# Altium footprint library connector.PcbLib: 172 footprints (part 6 of 11)
Each footprint in its own frame and in the unit in brackets; x right, y up, seen from the top. Pads: shape width x height; smd on the part's side, far side on the other; paste and mask are expansions set on the pad; w line width, h text height; cw(c..) or ccw(c..) is an arc to the next point about the centre after c.
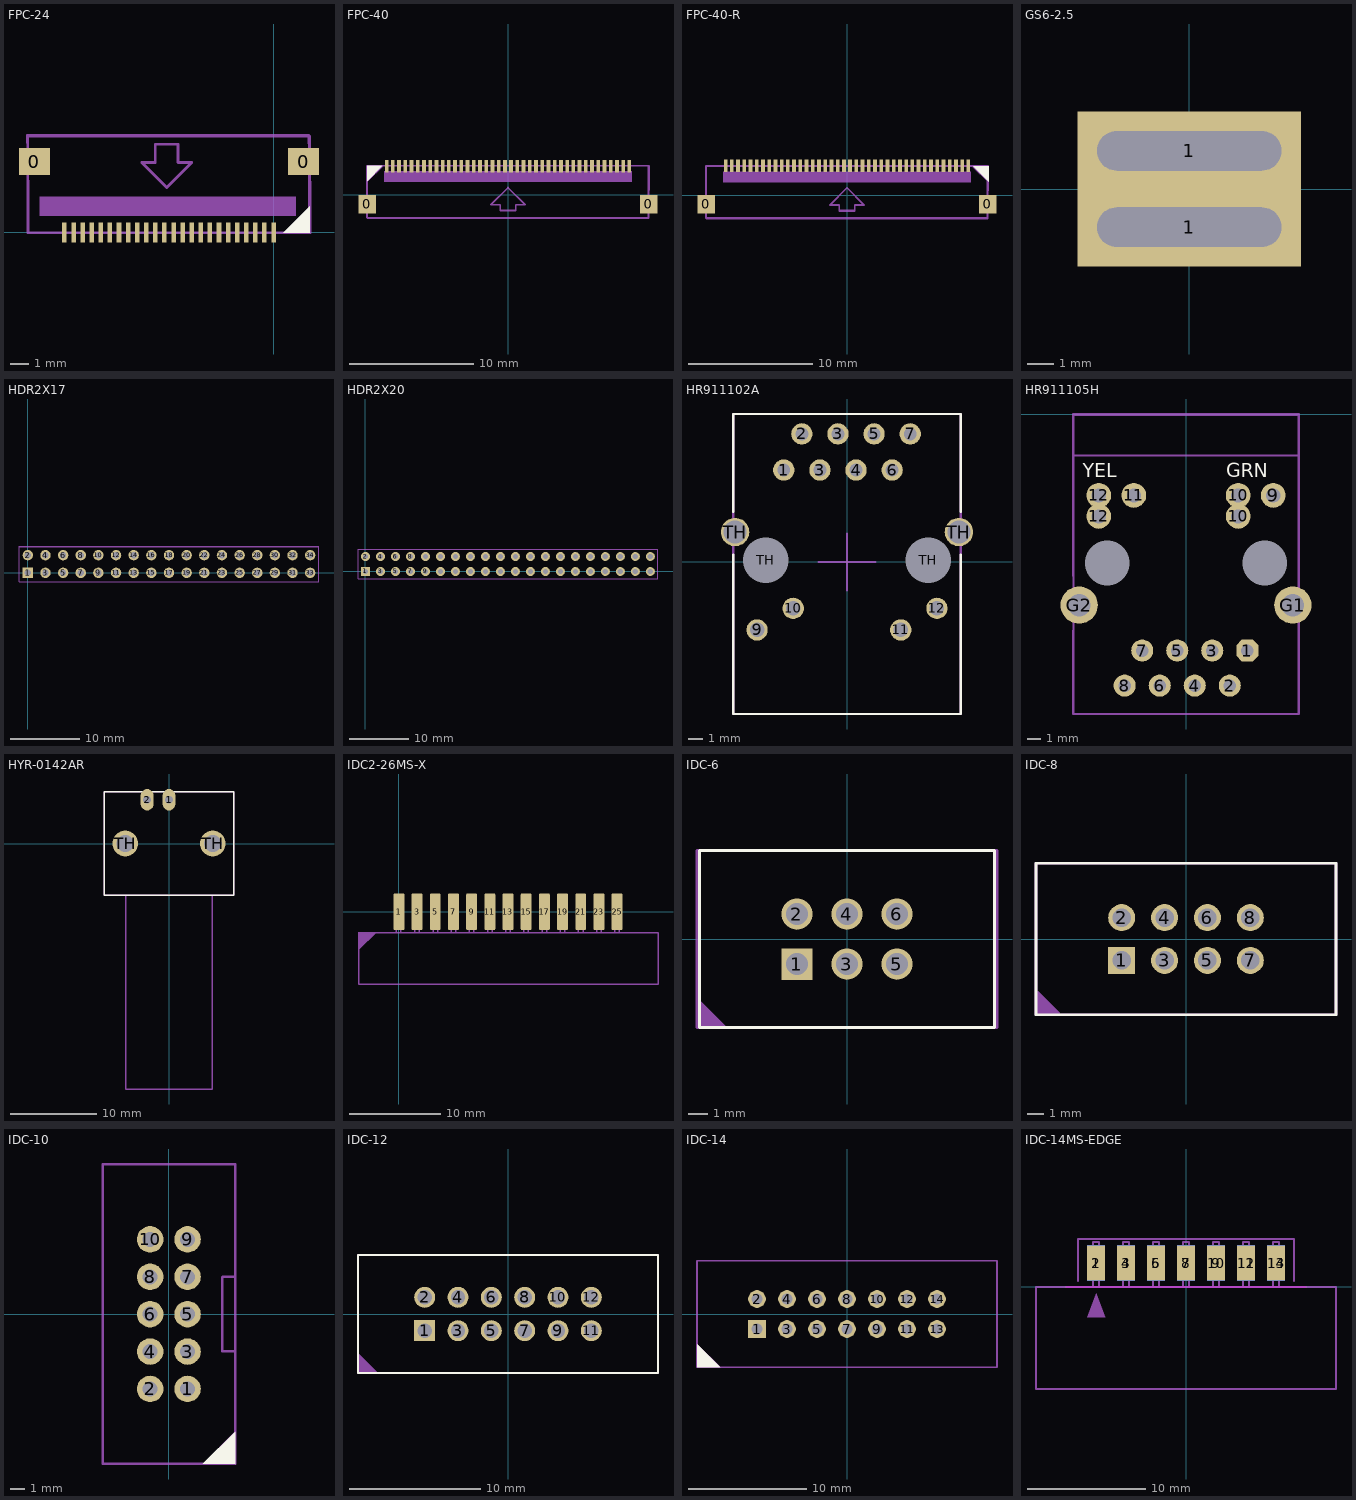
[diagram p5: the footprints below, top view; thin cyan lines are the x and y axes]

## FPC-24 [mm]
pads (26):
  rect 1.7x1.5 smd: 0(-13.15,3.9) 0(1.65,3.9)
  rect 0.25x1.1 smd: 1(0,0) 2(-0.5,0) 3(-1,0) 4(-1.5,0) 5(-2,0) 6(-2.5,0) 7(-3,0) 8(-3.5,0) 9(-4,0) 10(-4.5,0) 11(-5,0) 12(-5.5,0) 13(-6,0) 14(-6.5,0) 15(-7,0) 16(-7.5,0) 17(-8,0) 18(-8.5,0) 19(-9,0) 20(-9.5,0) 21(-10,0) 22(-10.5,0) 23(-11,0) 24(-11.5,0)
Top Overlay:
  region: 0.525,-0.025 2,-0.025 2,1.45
Mechanical 29:
  rectangle: -12.875,0.9 1.225,1.975
  region: 2,1.275 1.975,1.25 1.975,-0.025 0.7,-0.025
  lines w0.15: -13.55,4.925 -13.55,5.325 1.95,5.325 1.95,4.9 ; -13.5,2.85 -13.5,-0.025 -11.825,-0.025 ; 0.325,-0.025 2,-0.025 2,2.8 ; -7.25,3.85 -6.5,3.85 ; -7.25,3.85 -5.875,2.475 ; -7.25,3.85 -6.5,3.85 ; -7.25,3.85 -5.875,2.475 ; -6.5,3.85 -6.5,4.85 ; -6.5,3.85 -6.5,4.85 ; -6.5,4.85 -5.25,4.85 ; -6.5,4.85 -5.25,4.85 ; -5.875,2.475 -4.5,3.85 ; -5.875,2.475 -4.5,3.85 ; -5.25,3.85 -4.5,3.85 ; -5.25,3.85 -5.25,4.85 ; -5.25,3.85 -4.5,3.85 ; -5.25,3.85 -5.25,4.85 ; -13.525,-0.025 1.975,-0.025 1.975,5.3 -13.525,5.3 -13.525,-0.025
  text ".Designator" at -12.5,3.2 h1

## FPC-40 [mm]
pads (42):
  rect 1.4x1.5 smd: 0(-11.3,-0.75) 0(11.3,-0.75)
  rect 0.3x1 smd: 1(-9.75,2.3) 2(-9.25,2.3) 3(-8.75,2.3) 4(-8.25,2.3) 5(-7.75,2.3) 6(-7.25,2.3) 7(-6.75,2.3) 8(-6.25,2.3) 9(-5.75,2.3) 10(-5.25,2.3) 11(-4.75,2.3) 12(-4.25,2.3) 13(-3.75,2.3) 14(-3.25,2.3) 15(-2.75,2.3) 16(-2.25,2.3) 17(-1.75,2.3) 18(-1.25,2.3) 19(-0.75,2.3) 20(-0.25,2.3) 21(0.25,2.3) 22(0.75,2.3) 23(1.25,2.3) 24(1.75,2.3) 25(2.25,2.3) 26(2.75,2.3) 27(3.25,2.3) 28(3.75,2.3) 29(4.25,2.3) 30(4.75,2.3) 31(5.25,2.3) 32(5.75,2.3) 33(6.25,2.3) 34(6.75,2.3) 35(7.25,2.3) 36(7.75,2.3) 37(8.25,2.3) 38(8.75,2.3) 39(9.25,2.3) 40(9.75,2.3)
Top Overlay:
  region: -11.325,1.1 -11.325,2.325 -10.1,2.325
Mechanical 29:
  region: 9.95,1.9 -9.975,1.9 -9.975,1.025 9.95,1.025
  region: -11.3,1.025 -11.275,1.05 -11.275,2.325 -10,2.325
  lines w0.15: -11.325,0.375 -11.325,2.325 ; -11.3,-1.875 -0.55,-1.875 11.3,-1.875 ; -10.2,2.325 -11.325,2.325 ; 10.2,2.325 11.325,2.325 11.325,0.375 ; -11.325,2.325 -11.325,-1.85 11.3,-1.85 11.3,2.325 -11.325,2.325 ; -1.375,-0.8 0,0.575 ; -1.375,-0.8 -0.625,-0.8 ; -1.375,-0.8 0,0.575 ; -1.375,-0.8 -0.625,-0.8 ; -0.625,-0.8 -0.625,-1.25 0.625,-1.25 0.625,-0.8 ; -0.625,-0.8 -0.625,-1.275 0.625,-1.275 0.625,-0.8 ; 0,0.575 1.375,-0.8 ; 0,0.575 1.375,-0.8 ; 0.625,-0.8 1.375,-0.8 ; 0.625,-0.8 1.375,-0.8
  text ".Designator" at -8.5,-0.675 h1
3D body "FPC-40.STEP": height 1.2, standoff -0.02, extent -11.025,-0.95 10.975,2.05

## FPC-40-R [mm]
pads (42):
  rect 1.4x1.5 smd: 0(-11.3,-0.75) 0(11.3,-0.75)
  rect 0.3x1 smd: 1(9.75,2.35) 2(9.25,2.35) 3(8.75,2.35) 4(8.25,2.35) 5(7.75,2.35) 6(7.25,2.35) 7(6.75,2.35) 8(6.25,2.35) 9(5.75,2.35) 10(5.25,2.35) 11(4.75,2.35) 12(4.25,2.35) 13(3.75,2.35) 14(3.25,2.35) 15(2.75,2.35) 16(2.25,2.35) 17(1.75,2.35) 18(1.25,2.35) 19(0.75,2.35) 20(0.25,2.35) 21(-0.25,2.35) 22(-0.75,2.35) 23(-1.25,2.35) 24(-1.75,2.35) 25(-2.25,2.35) 26(-2.75,2.35) 27(-3.25,2.35) 28(-3.75,2.35) 29(-4.25,2.35) 30(-4.75,2.35) 31(-5.25,2.35) 32(-5.75,2.35) 33(-6.25,2.35) 34(-6.75,2.35) 35(-7.25,2.35) 36(-7.75,2.35) 37(-8.25,2.35) 38(-8.75,2.35) 39(-9.25,2.35) 40(-9.75,2.35)
Top Overlay:
  region: 10.142,2.308 11.367,2.308 11.367,1.083
Mechanical 29:
  region: 9.95,1.9 -9.975,1.9 -9.975,1.025 9.95,1.025
  region: 10.067,2.283 10.092,2.258 11.367,2.258 11.367,0.983
  lines w0.15: -11.325,0.375 -11.325,2.325 ; -11.3,-1.875 -0.55,-1.875 11.3,-1.875 ; -10.2,2.325 -11.325,2.325 ; 10.2,2.325 11.325,2.325 11.325,0.375 ; -11.325,2.325 -11.325,-1.85 11.3,-1.85 11.3,2.325 -11.325,2.325 ; -1.375,-0.8 0,0.575 ; -1.375,-0.8 -0.625,-0.8 ; -1.375,-0.8 0,0.575 ; -1.375,-0.8 -0.625,-0.8 ; -0.625,-0.8 -0.625,-1.275 0.625,-1.275 0.625,-0.8 ; -0.625,-0.8 -0.625,-1.25 0.625,-1.25 0.625,-0.8 ; 0,0.575 1.375,-0.8 ; 0,0.575 1.375,-0.8 ; 0.625,-0.8 1.375,-0.8 ; 0.625,-0.8 1.375,-0.8
  text ".Designator" at -10,-0.8 h1
3D body "FPC-40.STEP": height 1.2, standoff -0.02, extent -11.025,-0.95 10.975,2.05

## GS6-2.5 [mm]
pads (2):
  rect 8.5x3 hole 1.5 slot 7 at 0 deg: 1(0,-1.45) 1(0,1.45)
Multi-Layer:
  pour cut-out: -4.5,3 -3,3 -3,-3 -4.5,-3
3D body "GS6-2.5.STEP": height 1.15, standoff -2.75, extent -16.5,-5 2.5,5

## HDR2X17 [mm] "Connector; Header; 17x2 Position"
pads (34):
  rect 1.5x1.5 hole 0.9: 1(0,0)
  round 1.5 hole 0.9: 2(0,2.54) 3(2.54,0) 4(2.54,2.54) 5(5.08,0) 6(5.08,2.54) 7(7.62,0) 8(7.62,2.54) 9(10.16,0) 10(10.16,2.54) 11(12.7,0) 12(12.7,2.54) 13(15.24,0) 14(15.24,2.54) 15(17.78,0) 16(17.78,2.54) 17(20.32,0) 18(20.32,2.54) 19(22.86,0) 20(22.86,2.54) 21(25.4,0) 22(25.4,2.54) 23(27.94,0) 24(27.94,2.54) 25(30.48,0) 26(30.48,2.54) 27(33.02,0) 28(33.02,2.54) 29(35.56,0) 30(35.56,2.54) 31(38.1,0) 32(38.1,2.54) 33(40.64,0) 34(40.64,2.54)
Mechanical 29:
  lines w0.15: 41.9,3.81 -1.27,3.81 -1.27,-1.27 41.91,-1.27 41.91,3.81 ; -1.25,-1.25 -1.25,3.75 41.9,3.75 41.9,-1.25 -1.25,-1.25
  text ".Designator" at 17.5,1.2 h1

## HDR2X20 [mm] "Connector; Header; 20x2 Position"
pads (40):
  rect 1.5x1.5 hole 0.9: 1(0,0)
  round 1.5 hole 0.9: 2(0,2.54) 3(2.54,0) 4(2.54,2.54) 5(5.08,0) 6(5.08,2.54) 7(7.62,0) 8(7.62,2.54) 9(10.16,0) 10(10.16,2.54) 11(12.7,0) 12(12.7,2.54) 13(15.24,0) 14(15.24,2.54) 15(17.78,0) 16(17.78,2.54) 17(20.32,0) 18(20.32,2.54) 19(22.86,0) 20(22.86,2.54) 21(25.4,0) 22(25.4,2.54) 23(27.94,0) 24(27.94,2.54) 25(30.48,0) 26(30.48,2.54) 27(33.02,0) 28(33.02,2.54) 29(35.56,0) 30(35.56,2.54) 31(38.1,0) 32(38.1,2.54) 33(40.64,0) 34(40.64,2.54) 35(43.18,0) 36(43.18,2.54) 37(45.72,0) 38(45.72,2.54) 39(48.26,0) 40(48.26,2.54)
Mechanical 29:
  lines w0.15: -1.27,-1.27 -1.27,3.81 49.53,3.81 49.53,-1.27 -1.27,-1.27 ; -1.25,-1.25 49.55,-1.25 49.55,3.75 -1.25,3.75 -1.25,-1.25
  text ".Designator" at 21.5,0.7 h1
3D body "11437.stp": height 8.8, standoff -3, extent -1.25,-1.25 49.55,3.75

## HR911102A [mm]
height 14
pads (16):
  round 1.5 hole 0.9: 1(-4.445,6.46) 2(-3.175,9) 3(-1.905,6.46) 3(-0.635,9) 4(0.635,6.46) 5(1.905,9) 6(3.175,6.46) 7(4.445,9)
  round 1.5 hole 1.02: 9(-6.325,-4.79) 10(-3.785,-3.27) 11(3.785,-4.79) 12(6.325,-3.27)
  round 2 hole 1.6: TH(-7.875,2.1) TH(7.875,2.1)
  round 1.5 hole 3.2 unplated: TH(-5.715,0.11) TH(5.715,0.11)
Top Overlay:
  lines w0.15: -8,0.5 -8,-10.7 8,-10.7 8,0.5 ; -8,3.5 -8,10.4 8,10.4 8,3.5
Mechanical 15:
  lines w0.15: -2,0 2,0 ; 0,-2 0,2
Mechanical 29:
  lines w0.15: -8,-10.7 -8,10.4 8,10.4 8,-10.7 -8,-10.7
  text ".Designator" at -3.5,-0.8 h1
3D body: height 14, standoff 0.5, extent -8.075,-10.775 8.075,10.475
3D body: height 4, standoff 1.5, extent -6.5,-10.9 -3,-10.4
3D body: height 4, standoff 1.5, extent 3,-10.9 6.5,-10.4

## HR911105H [mm] "TRJ0011GBNL -- CONN RJ45  WITH MAGNETIC AND LEDS"
height 13.45
pads (18):
  oct 1.6x1.6 hole 0.9: 1(4.445,-17.15)
  round 1.6 hole 0.9: 2(3.175,-19.69) 3(1.905,-17.15) 4(0.635,-19.69) 5(-0.635,-17.15) 6(-1.905,-19.69) 7(-3.175,-17.15) 8(-4.445,-19.69)
  round 1.8 hole 1.02: 9(6.325,-5.9) 10(3.785,-7.42) 10(3.785,-5.9) 11(-3.785,-5.9) 12(-6.325,-7.42) 12(-6.325,-5.9)
  round 2.7 hole 1.63: G1(7.745,-13.85) G2(-7.745,-13.85)
  round 0 hole 3.25: ""(-5.715,-10.8) ""(5.715,-10.8)
Top Overlay:
  text "YEL" at -7.493,-4.572 h1.02
  text "GRN" at 2.921,-4.572 h1.02
Mechanical 29:
  lines w0.15: -8.19,-15.688 -8.19,-21.75 8.19,-21.75 8.19,-15.688 ; -8.19,-11.754 -8.19,0 8.19,0 8.19,-11.754 ; -8.19,-3 8.19,-3 ; -8.15,-21.75 8.175,-21.75 8.175,-0.075 -8.15,-0.075 -8.15,-21.75
  text ".Designator" at -3.5,-12.8 h1
3D body "User Library-bothhandusalu1t516-43-lf.step": height 13.32, standoff -3.71, extent -7.67,-21.325 7.57,-0.025

## HYR-0142AR [mm]
pads (4):
  oval 1.5x2.5 hole 0.9: 1(0,5.08) 2(-2.54,5.08)
  round 3 hole 2: TH(-5.08,0) TH(5.08,0)
Top Overlay:
  lines w0.15: -7.5,-6 -7.5,6 7.5,6 7.5,-6 -7.5,-6
Mechanical 29:
  lines w0.15: -5,-6 -5,-28.5 5,-28.5 5,-6 ; -7.5,-6 -7.5,6 7.5,6 7.5,-6 -7.5,-6
  text ".designator" at -5.5,0 h1.5
3D body "HYR-0142AR.STEP": height 12.5, standoff -4, extent -7.35,-28.45 7.35,6.05

## IDC2-26MS-X [mm]
pads (13):
  rrect20% 1.2x4 smd: 1(0,0) 3(2,0) 5(4,0) 7(6,0) 9(8,0) 11(10,0) 13(12,0) 15(14,0) 17(16,0) 19(18,0) 21(20,0) 23(22,0) 25(24,0)
Mechanical 29:
  region: -4.4,-2.3 -2.5,-2.3 -4.4,-4.2
  lines w0.15: -4.5,-2.3 28.5,-2.3 ; 28.5,-2.3 -4.4,-2.3 -4.4,-8 28.5,-8 28.5,-2.3 ; -0.3,-2.3 -0.3,1.6 0.2,1.6 0.2,-2.3 -0.3,-2.3 ; 1.75,-2.3 2.25,-2.3 2.25,1.6 1.75,1.6 1.75,-2.3 ; 3.75,-2.3 4.25,-2.3 4.25,1.6 3.75,1.6 3.75,-2.3 ; 5.75,-2.3 6.25,-2.3 6.25,1.6 5.75,1.6 5.75,-2.3 ; 7.75,-2.3 8.25,-2.3 8.25,1.6 7.75,1.6 7.75,-2.3 ; 9.75,-2.3 10.25,-2.3 10.25,1.6 9.75,1.6 9.75,-2.3 ; 11.75,-2.3 12.25,-2.3 12.25,1.6 11.75,1.6 11.75,-2.3 ; 13.75,-2.3 14.25,-2.3 14.25,1.6 13.75,1.6 13.75,-2.3 ; 15.75,-2.3 16.25,-2.3 16.25,1.6 15.75,1.6 15.75,-2.3 ; 17.75,-2.3 18.25,-2.3 18.25,1.6 17.75,1.6 17.75,-2.3 ; 19.75,-2.3 20.25,-2.3 20.25,1.6 19.75,1.6 19.75,-2.3 ; 21.75,-2.3 22.25,-2.3 22.25,1.6 21.75,1.6 21.75,-2.3 ; 23.75,-2.3 23.75,1.6 24.25,1.6 24.25,-2.3 23.75,-2.3
  text ".Designator" at 8.5,-5.8 h1
3D body "User Library-BH2-xx.step": height 3.95, standoff -1.5, extent -4.525,-7.9 28.475,1.35

## IDC-6 [mm]
height 8
pads (6):
  rect 1.6x1.6 hole 1.1: 1(-2.54,-1.27)
  round 1.6 hole 1.1: 2(-2.54,1.27) 3(0,-1.27) 4(0,1.27) 5(2.54,-1.27) 6(2.54,1.27)
Top Overlay:
  lines w0.15: -7.5,-4.5 -7.5,4.5 7.5,4.5 7.5,-4.5 -7.5,-4.5
Mechanical 29:
  region: -7.62,-4.5 -7.62,-2.976 -6.096,-4.5
  lines w0.15: -7.62,-4.5 7.62,-4.5 7.62,4.5 -7.62,4.5 -7.62,-4.5
  text ".Designator" at -3.5,-0.3 h1
3D body "PLS-1.STEP": height 8.5, standoff -3, extent -3.81,-2.54 -1.27,0
3D body "PLS-1.STEP": height 8.5, standoff -3, extent -3.81,0 -1.27,2.54
3D body "PLS-1.STEP": height 8.5, standoff -3, extent -1.27,0 1.27,2.54
3D body "PLS-1.STEP": height 8.5, standoff -3, extent -1.27,-2.54 1.27,0
3D body "PLS-1.STEP": height 8.5, standoff -3, extent 1.27,0 3.81,2.54
3D body "PLS-1.STEP": height 8.5, standoff -3, extent 1.27,-2.54 3.81,0
3D body: height 9, standoff 0, extent -7.5,-4.5 7.5,4.5
3D body: height 3, standoff 0, extent -7.5,-4.5 7.5,4.5

## IDC-8 [mm]
height 8
pads (8):
  rect 1.6x1.6 hole 1.1: 1(-3.81,-1.27)
  round 1.6 hole 1.1: 2(-3.81,1.27) 3(-1.27,-1.27) 4(-1.27,1.27) 5(1.27,-1.27) 6(1.27,1.27) 7(3.81,-1.27) 8(3.81,1.27)
Top Overlay:
  lines w0.15: -8.89,-4.5 -8.89,4.5 8.89,4.5 8.89,-4.5 -8.89,-4.5
Mechanical 29:
  region: -8.89,-4.5 -8.89,-2.976 -7.366,-4.5
  lines w0.15: -8.89,-4.5 8.89,-4.5 8.89,4.5 -8.89,4.5 -8.89,-4.5
  text ".Designator" at -3,-0.3 h1
3D body "PLS-1.STEP": height 8.5, standoff -3, extent -5.08,-2.54 -2.54,0
3D body "PLS-1.STEP": height 8.5, standoff -3, extent -5.08,0 -2.54,2.54
3D body "PLS-1.STEP": height 8.5, standoff -3, extent -2.54,0 0,2.54
3D body "PLS-1.STEP": height 8.5, standoff -3, extent -2.54,-2.54 0,0
3D body "PLS-1.STEP": height 8.5, standoff -3, extent 0,0 2.54,2.54
3D body "PLS-1.STEP": height 8.5, standoff -3, extent 0,-2.54 2.54,0
3D body "PLS-1.STEP": height 8.5, standoff -3, extent 2.54,0 5.08,2.54
3D body "PLS-1.STEP": height 8.5, standoff -3, extent 2.54,-2.54 5.08,0
3D body: height 3, standoff 0, extent -9,-4.5 9,4.5
3D body: height 9, standoff 0, extent -9,-4.5 9,4.5

## IDC-10 [mm]
pads (10):
  round 1.8 hole 1.02: 1(1.27,-5.08) 2(-1.27,-5.08) 3(1.27,-2.54) 4(-1.27,-2.54) 5(1.27,0) 6(-1.27,0) 7(1.27,2.54) 8(-1.27,2.54) 9(1.27,5.08) 10(-1.27,5.08)
Top Overlay:
  region: 4.5,-10.18 4.495,-10.175 2.3,-10.175 4.5,-7.975
Mechanical 29:
  region: 4.525,-10.16 4.52,-10.155 2.325,-10.155 4.525,-7.955
  lines w0.15: 3.625,-0.025 3.625,2.525 4.5,2.525 ; 3.625,0.025 3.625,-2.525 4.5,-2.525 ; 3.65,-0.005 3.65,2.545 4.525,2.545 ; 3.65,0.045 3.65,-2.505 4.525,-2.505 ; -4.5,-10.18 -4.5,10.18 4.5,10.18 4.5,-10.18 -4.5,-10.18 ; -4.475,-10.16 -4.475,10.2 4.525,10.2 4.525,-10.16 -4.475,-10.16
  text ".Designator" at -3,-0.3 h1
3D body "IDC-10.STEP": height 9.1, standoff -2.7, extent -4.6,-10.2 4.4,10.15

## IDC-12 [mm]
height 8
pads (12):
  rect 1.6x1.6 hole 1.1: 1(-6.35,-1.27)
  round 1.6 hole 1.1: 2(-6.35,1.27) 3(-3.81,-1.27) 4(-3.81,1.27) 5(-1.27,-1.27) 6(-1.27,1.27) 7(1.27,-1.27) 8(1.27,1.27) 9(3.81,-1.27) 10(3.81,1.27) 11(6.35,-1.27) 12(6.35,1.27)
Top Overlay:
  lines w0.15: -11.43,-4.5 -11.43,4.5 11.43,4.5 11.43,-4.5 -11.43,-4.5
Mechanical 29:
  region: -11.43,-4.5 -11.43,-2.976 -9.906,-4.5
  lines w0.15: -11.43,-4.5 11.43,-4.5 11.43,4.5 -11.43,4.5 -11.43,-4.5
  text ".Designator" at -3,-0.3 h1
3D body: height 3, standoff 0, extent -11.5,-4.5 11.5,4.5
3D body: height 9, standoff 0, extent -11.5,-4.5 11.5,4.5
3D body "PLS-1.STEP": height 8.5, standoff -3, extent -7.62,-2.54 -5.08,0
3D body "PLS-1.STEP": height 8.5, standoff -3, extent -7.62,0 -5.08,2.54
3D body "PLS-1.STEP": height 8.5, standoff -3, extent -5.08,0 -2.54,2.54
3D body "PLS-1.STEP": height 8.5, standoff -3, extent -5.08,-2.54 -2.54,0
3D body "PLS-1.STEP": height 8.5, standoff -3, extent -2.54,0 0,2.54
3D body "PLS-1.STEP": height 8.5, standoff -3, extent -2.54,-2.54 0,0
3D body "PLS-1.STEP": height 8.5, standoff -3, extent 0,0 2.54,2.54
3D body "PLS-1.STEP": height 8.5, standoff -3, extent 0,-2.54 2.54,0
3D body "PLS-1.STEP": height 8.5, standoff -3, extent 2.54,0 5.08,2.54
3D body "PLS-1.STEP": height 8.5, standoff -3, extent 2.54,-2.54 5.08,0
3D body "PLS-1.STEP": height 8.5, standoff -3, extent 5.08,0 7.62,2.54
3D body "PLS-1.STEP": height 8.5, standoff -3, extent 5.08,-2.54 7.62,0

## IDC-14 [mm]
pads (14):
  rect 1.5x1.5 hole 0.9: 1(-7.62,-1.27)
  round 1.5 hole 0.9: 2(-7.62,1.27) 3(-5.08,-1.27) 4(-5.08,1.27) 5(-2.54,-1.27) 6(-2.54,1.27) 7(0,-1.27) 8(0,1.27) 9(2.54,-1.27) 10(2.54,1.27) 11(5.08,-1.27) 12(5.08,1.27) 13(7.62,-1.27) 14(7.62,1.27)
Top Overlay:
  region: -12.7,-4.5 -12.7,-2.54 -10.74,-4.5
Mechanical 29:
  region: -12.664,-4.5 -12.664,-2.54 -10.704,-4.5
  lines w0.15: -12.7,-4.5 12.7,-4.5 ; -12.7,-4.5 -12.7,4.5 ; -12.7,-4.5 -12.7,4.5 ; -12.7,-4.5 12.7,-4.5 ; -12.7,4.5 12.7,4.5 ; -12.7,4.5 12.7,4.5 ; 12.7,-4.5 12.7,4.5 ; 12.7,-4.5 12.7,4.5
  text ".Designator" at -3,-0.3 h1
3D body "IDC-14MS.STEP": height 10.25, standoff -2.45, extent -12.725,-4.42 12.675,4.93

## IDC-14MS-EDGE [mm]
pads (14):
  rect 1.5x3 smd far side: 1(-7.62,2) 3(-5.08,2) 5(-2.54,2) 7(0,2) 9(2.54,2) 11(5.08,2) 13(7.62,2)
  rect 1.5x3 smd: 2(-7.62,2) 4(-5.08,2) 6(-2.54,2) 8(0,2) 10(2.54,2) 12(5.08,2) 14(7.62,2)
Bottom Overlay:
  region: -9.144,4.032 -9.144,0.476 -8.636,0.476 -8.636,4.032
  lines w0.15: -9.144,0.476 -9.144,4.032 0,4.032 9.144,4.032 9.144,0.476
Keep-Out Layer:
  lines w0.15: -10.16,-0.032 10.16,-0.032
Mechanical 29:
  lines w0.15: -9.144,0.476 -9.144,4.032 0,4.032 9.144,4.032 9.144,0.476 ; -12.7,-8.668 -12.7,-0.032 12.7,-0.032 12.7,-8.668 -12.7,-8.668 ; -7.874,-0.032 -7.366,-0.032 -7.366,3.778 -7.874,3.778 -7.874,-0.032 ; -5.334,-0.032 -5.334,3.778 -4.826,3.778 -4.826,-0.032 -5.334,-0.032 ; -2.794,-0.032 -2.794,3.778 -2.286,3.778 -2.286,-0.032 -2.794,-0.032 ; -0.254,-0.032 -0.254,3.778 0.254,3.778 0.254,-0.032 -0.254,-0.032 ; 2.286,-0.032 2.286,3.778 2.794,3.778 2.794,-0.032 2.286,-0.032 ; 4.826,-0.032 4.826,3.778 5.334,3.778 5.334,-0.032 4.826,-0.032 ; 7.366,-0.032 7.366,3.778 7.874,3.778 7.874,-0.032 7.366,-0.032
Mechanical 30:
  region: -7.62,-0.54 -8.382,-2.572 -6.858,-2.572
  lines w0.15: -12.7,-8.668 12.7,-8.668 12.7,-0.032 -12.7,-0.032 -12.7,-8.668 ; -7.874,-0.032 -7.874,3.778 -7.366,3.778 -7.366,-0.032 -7.874,-0.032 ; -5.334,-0.032 -4.826,-0.032 -4.826,3.778 -5.334,3.778 -5.334,-0.032 ; -2.794,-0.032 -2.286,-0.032 -2.286,3.778 -2.794,3.778 -2.794,-0.032 ; -0.254,-0.032 0.254,-0.032 0.254,3.778 -0.254,3.778 -0.254,-0.032 ; 2.286,-0.032 2.794,-0.032 2.794,3.778 2.286,3.778 2.286,-0.032 ; 4.826,-0.032 5.334,-0.032 5.334,3.778 4.826,3.778 4.826,-0.032 ; 7.366,-0.032 7.874,-0.032 7.874,3.778 7.366,3.778 7.366,-0.032
  text ".Designator" at 4.318,-5.112 h2
3D body "IDC-14MS.STEP": height 3.57, standoff -5.77, extent -12.7,-8.719 12.7,3.981